# Altium footprint library ESP32-DEVKITC-32D.PcbLib: 1 footprints
Each footprint in its own frame and in the unit in brackets; x right, y up, seen from the top. Pads: shape width x height; smd on the part's side, far side on the other; paste and mask are expansions set on the pad; w line width, h text height; cw(c..) or ccw(c..) is an arc to the next point about the centre after c.
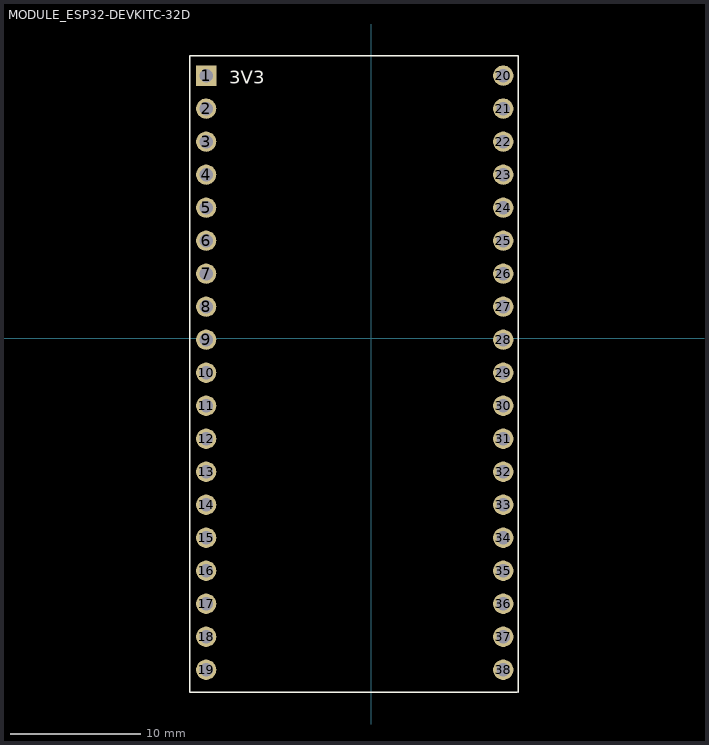
[diagram p0: the footprint, top view; thin cyan lines are the x and y axes]

## MODULE_ESP32-DEVKITC-32D [mm]
pads (38):
  rect 1.56x1.56 hole 1.04: 1(-12.7,20.193)
  round 1.56 hole 1.04: 2(-12.7,17.653) 3(-12.7,15.113) 4(-12.7,12.573) 5(-12.7,10.033) 6(-12.7,7.493) 7(-12.7,4.953) 8(-12.7,2.413) 9(-12.7,-0.127) 10(-12.7,-2.667) 11(-12.7,-5.207) 12(-12.7,-7.747) 13(-12.7,-10.287) 14(-12.7,-12.827) 15(-12.7,-15.367) 16(-12.7,-17.907) 17(-12.7,-20.447) 18(-12.7,-22.987) 19(-12.7,-25.527) 20(10.16,20.193) 21(10.16,17.653) 22(10.16,15.113) 23(10.16,12.573) 24(10.16,10.033) 25(10.16,7.493) 26(10.16,4.953) 27(10.16,2.413) 28(10.16,-0.127) 29(10.16,-2.667) 30(10.16,-5.207) 31(10.16,-7.747) 32(10.16,-10.287) 33(10.16,-12.827) 34(10.16,-15.367) 35(10.16,-17.907) 36(10.16,-20.447) 37(10.16,-22.987) 38(10.16,-25.527)
Top Overlay:
  lines w0.127: 11.231,-27.25 -13.95,-27.25 -13.95,21.717 11.303,21.717 11.303,-27.25
  text "3V3" at -10.922,19.558 h1.02
3D body "ESP32S Dev Board 0.9inch width ASSY.SLDPRT": height 7.39, standoff -5.75, extent -14.351,-27.47 11.557,21.844